# Altium footprint library mainLib.PcbLib: 169 footprints (part 1 of 11)
Each footprint in its own frame and in the unit in brackets; x right, y up, seen from the top. Pads: shape width x height; smd on the part's side, far side on the other; paste and mask are expansions set on the pad; w line width, h text height; cw(c..) or ccw(c..) is an arc to the next point about the centre after c.
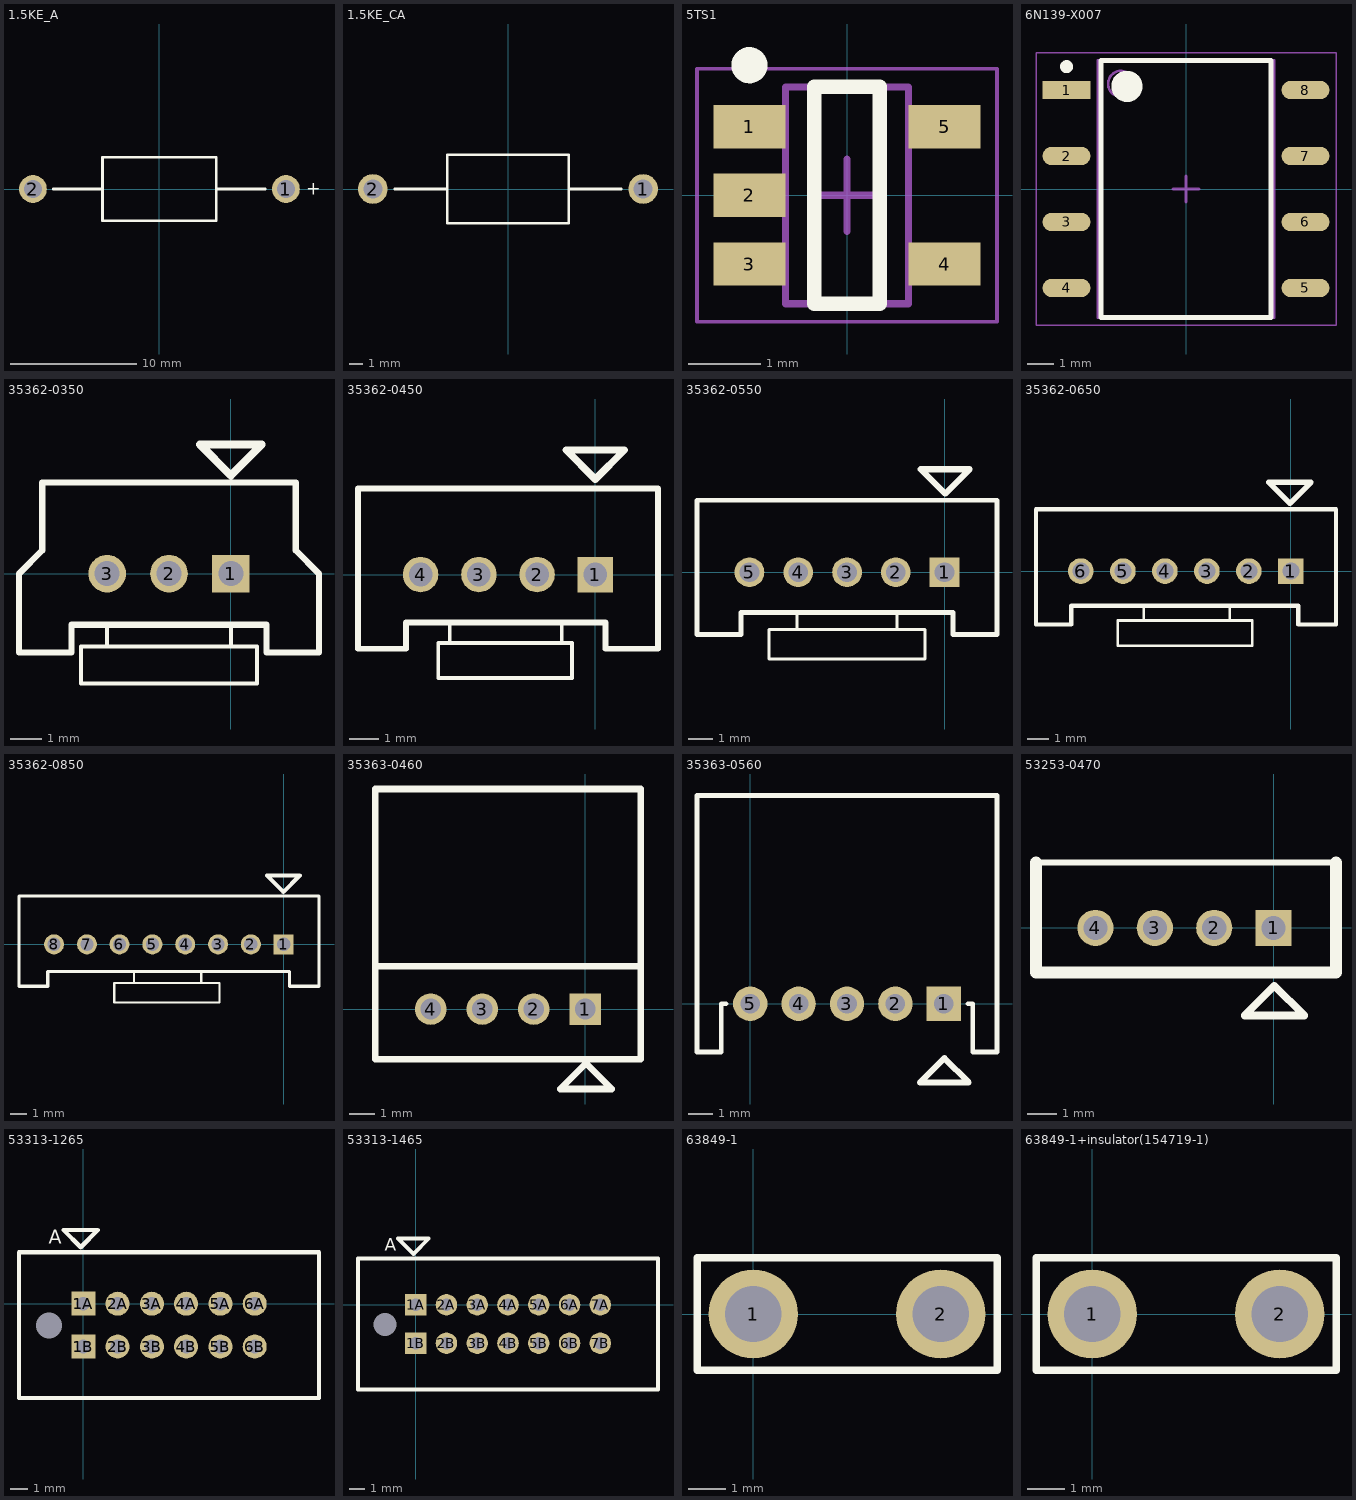
[diagram p0: the footprints below, top view; thin cyan lines are the x and y axes]

## 1.5KE_A [mm] "AXIAL, 2-Leads, Diameter 5.05mm"
height 7
pads (2):
  round 2.2 hole 1.4: 1(10,0) 2(-10,0)
Top Overlay:
  lines w0.2: -8.382,0 -4.5,0 ; 4.5,0 8.382,0 ; -4.5,-2.525 -4.5,2.525 4.5,2.525 4.5,-2.525 -4.5,-2.525
  text "+" at 11.6,-0.45 h1.02
3D body "do-201ad.STEP": height 6.55, standoff -2.5, extent -10.55,-2.55 10.55,2.55

## 1.5KE_CA [mm] "AXIAL, 2-Leads, Diameter 5.05mm"
height 7
pads (2):
  round 2.2 hole 1.4: 1(10,0) 2(-10,0)
Top Overlay:
  lines w0.2: -8.382,0 -4.5,0 ; 4.5,0 8.382,0 ; -4.5,-2.525 4.5,-2.525 4.5,2.525 -4.5,2.525 -4.5,-2.525
3D body "do-201ad.STEP": height 6.55, standoff -2.5, extent -10.55,-2.55 10.55,2.55

## 5TS1 [mm] "SOT23, 5-Leads, Body 2,90x2,80mm, Pitch 0,95mm, IPC Medium Density"
height 1
pads (5):
  rect 1x0.6 smd: 1(-1.35,0.95) 2(-1.35,0) 3(-1.35,-0.95) 4(1.35,-0.95) 5(1.35,0.95)
Top Overlay:
  circle w0.25: c-1.35,1.8 r0.125
  lines w0.2: -0.45,-1.5 -0.45,1.5 0.45,1.5 0.45,-1.5 -0.45,-1.5
Mechanical 13:
  lines w0.1: -0.85,-1.5 0.85,-1.5 0.85,1.5 -0.85,1.5 -0.85,-1.5
Mechanical 15:
  lines w0.05: -2.075,-1.75 2.075,-1.75 2.075,1.75 -2.075,1.75 -2.075,-1.75
  lines w0.1: -0.5,0 0.5,0 ; 0,-0.5 0,0.5
3D body: height 1, standoff 0.05, extent -0.85,-1.5 0.85,1.5

## 6N139-X007 [mm] "SOP, 8-Leads, Body 9,77x6,65mm, Pitch 2,54mm, IPC Medium Density"
height 4.6
pads (8):
  rect 1.85x0.7 smd: 1(-4.6,3.81)
  oval 1.85x0.7 smd: 2(-4.6,1.27) 3(-4.6,-1.27) 4(-4.6,-3.81) 5(4.6,-3.81) 6(4.6,-1.27) 7(4.6,1.27) 8(4.6,3.81)
Top Overlay:
  circle w0.6: c-2.275,3.95 r0.3
  circle w0.25: c-4.6,4.71 r0.125
  lines w0.2: -3.275,-4.95 3.275,-4.95 3.275,4.95 -3.275,4.95 -3.275,-4.95
Mechanical 13:
  circle w0.1: c-2.5,4.05 r0.5
  lines w0.1: -3.4,-4.95 3.4,-4.95 3.4,4.95 -3.4,4.95 -3.4,-4.95
Mechanical 15:
  lines w0.05: -5.775,-5.25 5.775,-5.25 5.775,5.25 -5.775,5.25 -5.775,-5.25
  lines w0.1: -0.5,0 0.5,0 ; 0,-0.5 0,0.5
3D body "SOP254P1020X460-8N.step": height 4.6, standoff 0, extent -5.1,-4.95 5.1,4.95

## 35362-0350 [mil]
pads (3):
  rect 48x48 / inner round 0 / far side rect 48x48 hole 32 mask+4.97: 1(0,0)
  round 48 / inner round 0 / far side round 48 hole 32 mask+4.97: 2(-78.73,0) 3(-157.47,0)
Top Overlay:
  lines w5: -157.47,-64.95 -157.47,-92.52 0,-92.52 0,-64.95 ; -190.93,-139.75 33.45,-139.75 33.45,-92.52 -190.93,-92.52 -190.93,-139.75
  lines w7.87: -157.47,-64.95 0,-64.95 ; -269.68,-100.38 -269.68,0 -240.15,29.52 -240.15,116.13 82.67,116.13 82.67,29.52 112.2,0 112.2,-100.38 45.27,-100.38 45.27,-64.95 -202.75,-64.95 -202.75,-100.38 -269.68,-100.38
  lines w10: -39.37,164.37 39.37,164.37 0,125 -39.37,164.37
3D body "353620350.stp": height 335.32, standoff -129.24, extent -269.94,-103.23 111.95,115.27

## 35362-0450 [mil]
pads (4):
  rect 48x48 / inner round 0 / far side rect 48x48 hole 32 mask+4.97: 1(0,0)
  round 48 / inner round 0 / far side round 48 hole 32 mask+4.97: 2(-78.73,0) 3(-157.47,0) 4(-236.22,0)
Top Overlay:
  lines w5: -212.58,-139.75 -212.58,-92.52 -31.48,-92.52 -31.48,-139.75 -212.58,-139.75 ; -196.85,-92.52 -45.27,-92.52 -45.27,-64.95 -196.85,-64.95 -196.85,-92.52
  lines w7.87: -320.85,-100.38 -255.9,-100.38 -255.9,-64.95 13.77,-64.95 13.77,-100.38 84.63,-100.38 84.63,116.13 -320.85,116.13 -320.85,-100.38
  lines w10: -39.37,168.31 0,128.94 39.37,168.31 -39.37,168.31
3D body "353620450.stp": height 335.32, standoff -129.24, extent -320.75,-102.23 84.76,116.28

## 35362-0550 [mil]
pads (5):
  rect 48x48 / inner round 0 / far side rect 48x48 hole 32 mask+4.97: 1(0,0)
  round 48 / inner round 0 / far side round 48 hole 32 mask+4.97: 2(-78.73,0) 3(-157.47,0) 4(-236.22,0) 5(-314.95,0)
Top Overlay:
  lines w5: -283.45,-139.75 -283.45,-92.52 -31.48,-92.52 -31.48,-139.75 -283.45,-139.75 ; -238.18,-92.52 -76.77,-92.52 -76.77,-64.95 -238.18,-64.95 -238.18,-92.52
  lines w7.87: -399.6,-100.38 -399.6,116.13 84.63,116.13 84.63,-100.38 13.77,-100.38 13.77,-64.95 -328.73,-64.95 -328.73,-100.38 -399.6,-100.38
  lines w10: -38.39,166.34 40.35,166.34 0.98,126.97 -38.39,166.34
3D body "353620550.stp": height 335.32, standoff -129.24, extent -399.12,-102.23 85.13,116.28

## 35362-0650 [mil]
pads (6):
  rect 48x48 / inner round 0 / far side rect 48x48 hole 32 mask+4.97: 1(0,0)
  round 48 / inner round 0 / far side round 48 hole 32 mask+4.97: 2(-78.73,0) 3(-157.47,0) 4(-236.22,0) 5(-314.95,0) 6(-394,0)
Top Overlay:
  lines w5: -324.45,-139.75 -72.48,-139.75 -72.48,-92.52 -324.45,-92.52 -324.45,-139.75 ; -276.18,-92.52 -114.77,-92.52 -114.77,-64.95 -276.18,-64.95 -276.18,-92.52
  lines w7.87: -478,-100.38 -478,116.13 84.63,116.13 84.63,-100.38 13.77,-100.38 13.77,-64.95 -328.73,-64.95 -412,-65 -412,-100.38 -478,-100.38
  lines w10: -41.34,166.34 -1.97,126.97 37.4,166.34 -41.34,166.34
3D body "353620650.stp": height 335.32, standoff -129.24, extent -478.49,-102.23 84.5,116.28

## 35362-0850 [mil]
pads (8):
  rect 48x48 / inner round 0 / far side rect 48x48 hole 32 mask+4.97: 1(0,0)
  round 48 / inner round 0 / far side round 48 hole 32 mask+4.97: 2(-78.73,0) 3(-157.47,0) 4(-236.22,0) 5(-314.95,0) 6(-394,0) 7(-472,0) 8(-551,0)
Top Overlay:
  lines w5: -406.45,-139.75 -154.48,-139.75 -154.48,-92.52 -406.45,-92.52 -406.45,-139.75 ; -359.18,-92.52 -197.77,-92.52 -197.77,-64.95 -359.18,-64.95 -359.18,-92.52
  lines w7.87: -635,-100.38 -566,-100.38 -566,-65 -328.73,-64.95 13.77,-64.95 13.77,-100.38 84.63,-100.38 84.63,116.13 -399.6,116.13 -635,116 -635,-100.38
  lines w10: -40.35,165.35 38.39,165.35 -0.98,125.98 -40.35,165.35
3D body "353620850.stp": height 334.65, standoff -129.92, extent -635.82,-102.36 84.65,116.15

## 35363-0460 [mil]
pads (4):
  rect 48x48 / inner round 0 / far side rect 48x48 hole 32 mask+4.97: 1(0,0)
  round 48 / inner round 0 / far side round 48 hole 32 mask+4.97: 2(-78.73,0) 3(-157.47,0) 4(-236.22,0)
Top Overlay:
  lines w10: -319.88,65.94 84.65,65.94 ; -320.87,-76.77 -320.87,336.61 84.65,336.61 84.65,-76.77 -320.87,-76.77 ; -38.39,-122.05 0.98,-82.68 40.35,-122.05 -38.39,-122.05
3D body "353630460.stp": height 217.04, standoff -125.48, extent -320.85,-76.76 84.66,336.62

## 35363-0560 [mil]
pads (5):
  rect 56x56 / inner round 0 / far side rect 56x56 hole 32 mask+4.97: 1(314.95,0)
  round 56 / inner round 0 / far side round 56 hole 32 mask+4.97: 2(236.22,0) 3(157.47,0) 4(78.73,0) 5(0,0)
Top Overlay:
  lines w7.87: -39.37,0 -47.23,0 -47.23,-78.73 -86.6,-78.73 -86.6,338.57 0,338.57 314.93,338.57 401.58,338.57 401.58,-78.73 362.22,-78.73 362.22,0 354.35,0
  lines w10: 276.57,-127.95 315.94,-88.58 355.31,-127.95 276.57,-127.95
3D body "353630560.stp": height 217.27, standoff -125.25, extent -84.12,-77.06 400.13,336.33

## 53253-0470 [mil]
pads (4):
  rect 48x48 / inner round 0 / far side rect 48x48 hole 32 mask+4.97: 1(0,0)
  round 48 / inner round 0 / far side round 48 hole 32 mask+4.97: 2(-78.73,0) 3(-157.47,0) 4(-236.22,0)
Top Overlay:
  lines w5: -238.18,-64.95 -76.77,-64.95
  lines w7.87: -314.96,86.61 82.68,86.61
  lines w10: -38.39,-116.14 40.35,-116.14 0.98,-76.77 -38.39,-116.14
  lines w15.75: -314.96,86.61 -314.96,-59.06 82.68,-59.06 82.68,86.61
3D body "532530470.stp": height 217.04, standoff -97.93, extent -314.95,-59.05 78.75,84.65

## 53313-1265 [mm] "MI II"
pads (13):
  round 0 hole 1.5: 0(-2,-1.27)
  rect 1.4x1.4 hole 0.8: 1A(0,0) 1B(0,-2.5)
  round 1.4 hole 0.8: 2A(2,0) 2B(2,-2.5) 3A(4,0) 3B(4,-2.5) 4A(6,0) 4B(6,-2.5) 5A(8,0) 5B(8,-2.5) 6A(10,0) 6B(10,-2.5)
Top Overlay:
  lines w0.254: -3.75,-5.5 -3.75,3 13.75,3 13.75,-5.5 -3.75,-5.5 ; -1.15,4.3 -0.15,3.3 0.85,4.3 -1.15,4.3
  text "A" at -2,3.5 h0.8
3D body "533131265.stp": height 6.51, standoff -3.49, extent -3.7,-5.5 13.7,3

## 53313-1465 [mm] "MI II"
pads (15):
  round 0 hole 1.5: 1(-2,-1.27)
  rect 1.4x1.4 hole 0.8: 1A(0,0) 1B(0,-2.5)
  round 1.4 hole 0.8: 2A(2,0) 2B(2,-2.5) 3A(4,0) 3B(4,-2.5) 4A(6,0) 4B(6,-2.5) 5A(8,0) 5B(8,-2.5) 6A(10,0) 6B(10,-2.5) 7A(12,0) 7B(12,-2.5)
Top Overlay:
  lines w0.254: -3.75,-5.5 -3.75,3 15.75,3 15.75,-5.5 -3.75,-5.5 ; -1.15,4.3 0.85,4.3 -0.15,3.3 -1.15,4.3
  text "A" at -2,3.5 h0.8
3D body "533131465.stp": height 6.51, standoff -3.49, extent -3.7,-5.5 15.7,3

## 63849-1 [mil]
height 400
pads (2):
  round 95 hole 60: 1(0,0) 2(200,0)
Top Overlay:
  lines w8: -60,-60 -60,60 260,60 260,-60 -60,-60
3D body "c-63849-1-k-3d.stp": height 409, standoff -143, extent -56,-60 256,61.5

## 63849-1+insulator(154719-1) [mil]
height 400
pads (2):
  round 95 hole 60: 1(0,0) 2(200,0)
Top Overlay:
  lines w8: -60,-60 260,-60 260,60 -60,60 -60,-60
3D body "c-154718-3-as-3d.stp": height 913.98, standoff 38.06, extent -46.55,-98.43 243.4,113.8
3D body "c-154719-1-av-3d.stp": height 955.12, standoff 0, extent -106.1,-140.79 278.54,142.28
3D body "c-63849-1-k-3d.stp": height 409, standoff -143, extent -56,-60 256,61.5